# Altium footprint library Footprints.PcbLib: 67 footprints (part 3 of 5)
Each footprint in its own frame and in the unit in brackets; x right, y up, seen from the top. Pads: shape width x height; smd on the part's side, far side on the other; paste and mask are expansions set on the pad; w line width, h text height; cw(c..) or ccw(c..) is an arc to the next point about the centre after c.
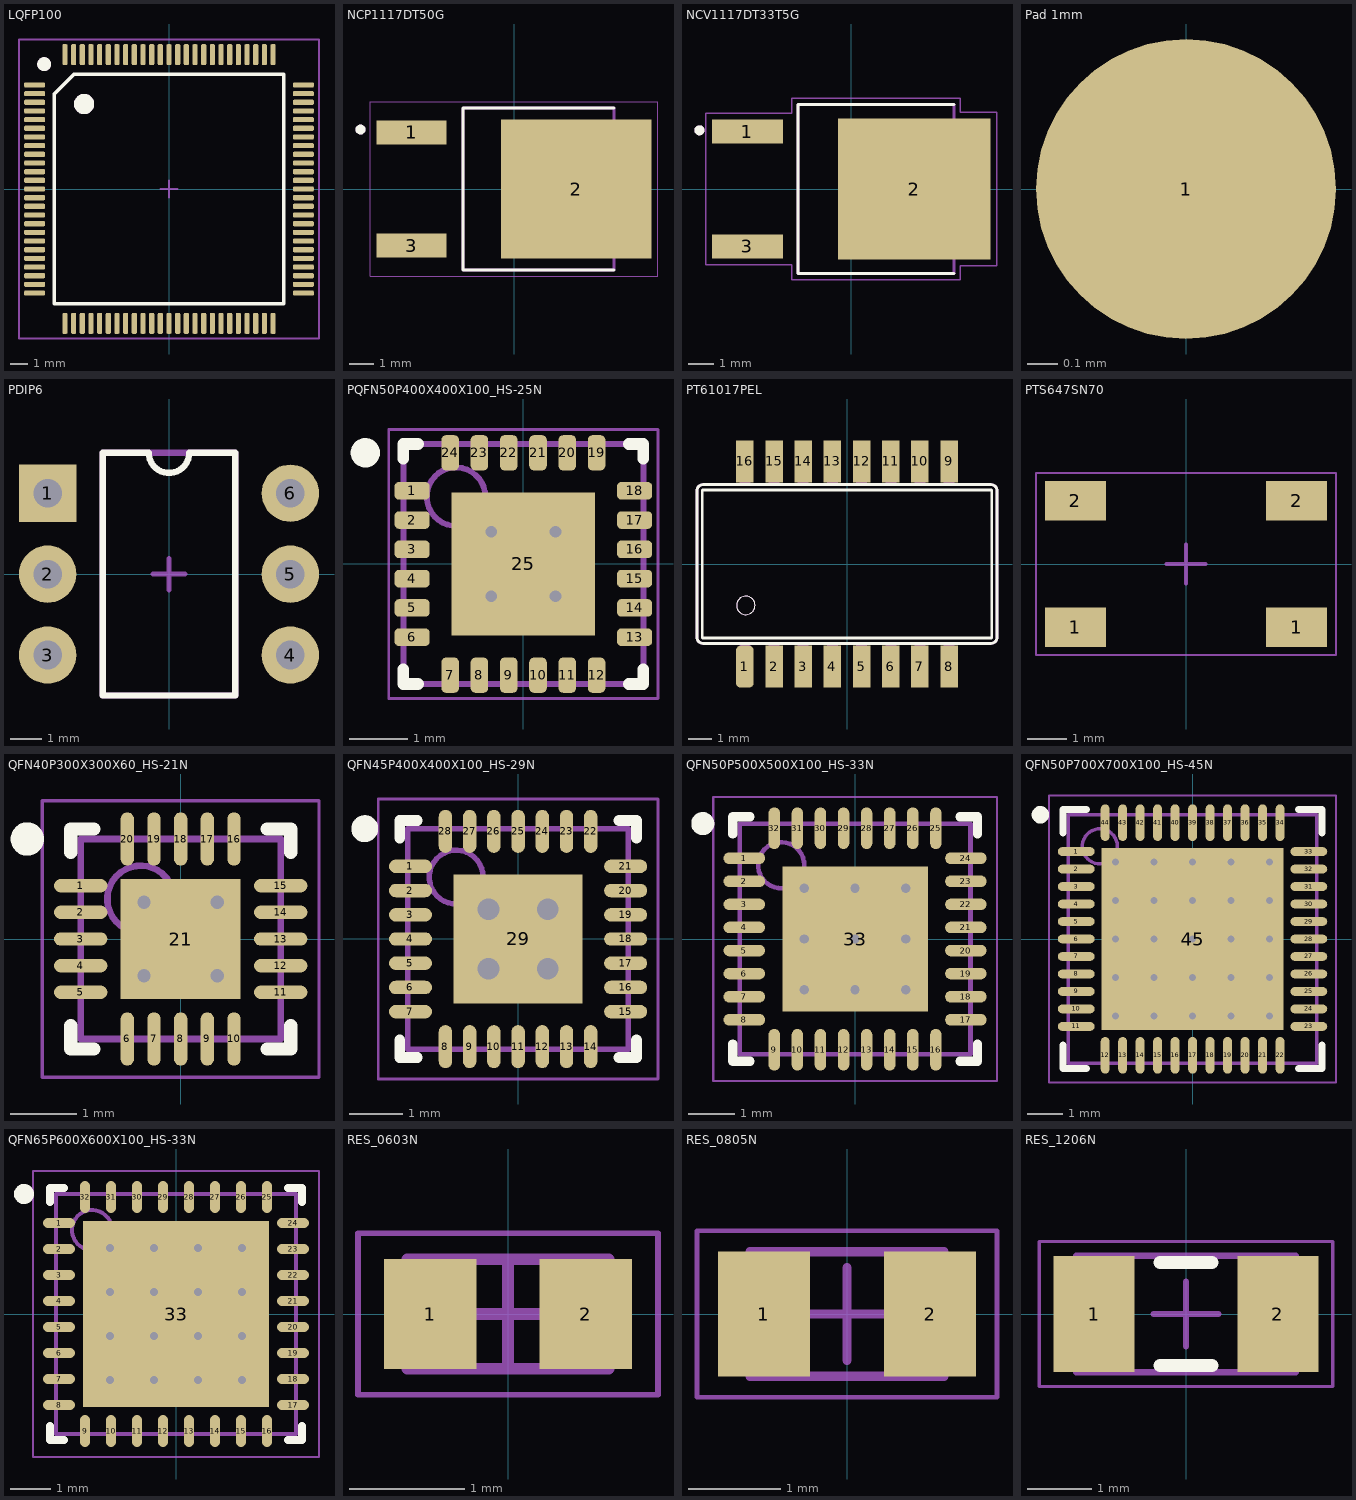
[diagram p2: the footprints below, top view; thin cyan lines are the x and y axes]

## LQFP100 [mm]
pads (100):
  rrect50% 1.2x0.3 smd: 1(-7.75,6) 2(-7.75,5.5) 3(-7.75,5) 4(-7.75,4.5) 5(-7.75,4) 6(-7.75,3.5) 7(-7.75,3) 8(-7.75,2.5) 9(-7.75,2) 10(-7.75,1.5) 11(-7.75,1) 12(-7.75,0.5) 13(-7.75,0) 14(-7.75,-0.5) 15(-7.75,-1) 16(-7.75,-1.5) 17(-7.75,-2) 18(-7.75,-2.5) 19(-7.75,-3) 20(-7.75,-3.5) 21(-7.75,-4) 22(-7.75,-4.5) 23(-7.75,-5) 24(-7.75,-5.5) 25(-7.75,-6) 51(7.75,-6) 52(7.75,-5.5) 53(7.75,-5) 54(7.75,-4.5) 55(7.75,-4) 56(7.75,-3.5) 57(7.75,-3) 58(7.75,-2.5) 59(7.75,-2) 60(7.75,-1.5) 61(7.75,-1) 62(7.75,-0.5) 63(7.75,0) 64(7.75,0.5) 65(7.75,1) 66(7.75,1.5) 67(7.75,2) 68(7.75,2.5) 69(7.75,3) 70(7.75,3.5) 71(7.75,4) 72(7.75,4.5) 73(7.75,5) 74(7.75,5.5) 75(7.75,6)
  rrect50% 0.3x1.2 smd: 26(-6,-7.75) 27(-5.5,-7.75) 28(-5,-7.75) 29(-4.5,-7.75) 30(-4,-7.75) 31(-3.5,-7.75) 32(-3,-7.75) 33(-2.5,-7.75) 34(-2,-7.75) 35(-1.5,-7.75) 36(-1,-7.75) 37(-0.5,-7.75) 38(0,-7.75) 39(0.5,-7.75) 40(1,-7.75) 41(1.5,-7.75) 42(2,-7.75) 43(2.5,-7.75) 44(3,-7.75) 45(3.5,-7.75) 46(4,-7.75) 47(4.5,-7.75) 48(5,-7.75) 49(5.5,-7.75) 50(6,-7.75) 76(6,7.75) 77(5.5,7.75) 78(5,7.75) 79(4.5,7.75) 80(4,7.75) 81(3.5,7.75) 82(3,7.75) 83(2.5,7.75) 84(2,7.75) 85(1.5,7.75) 86(1,7.75) 87(0.5,7.75) 88(0,7.75) 89(-0.5,7.75) 90(-1,7.75) 91(-1.5,7.75) 92(-2,7.75) 93(-2.5,7.75) 94(-3,7.75) 95(-3.5,7.75) 96(-4,7.75) 97(-4.5,7.75) 98(-5,7.75) 99(-5.5,7.75) 100(-6,7.75)
Top Overlay:
  circle w0.6: c-4.9,4.9 r0.283
  circle w0.4: c-7.2,7.2 r0.2
  lines w0.2: -6.615,-6.615 6.615,-6.615 6.615,6.615 -5.48,6.615 -6.615,5.48 -6.615,-6.615
Polarity (Mech13):
  circle w0.6: c-4.9,4.9 r0.283
  circle w0.4: c-7.2,7.2 r0.2
Mechanical 15:
  lines w0.1: -0.5,0 0.5,0 ; 0,-0.5 0,0.5 ; -8.65,-8.625 8.65,-8.625 8.65,8.625 -8.65,8.625 -8.65,-8.625
3D body "User Library-LQFP100-3.STEP": height 1.64, standoff 0.01, extent -8.072,-8.072 8.072,8.072

## NCP1117DT50G [mm] "LDO 5V"
pads (3):
  rect 2.83x0.97 smd: 1(-4.14,2.29) 3(-4.14,-2.29)
  rect 6.09x5.63 smd paste-4: 2(2.51,0)
Top Overlay:
  circle w0.2: c-6.2,2.4 r0.1
  lines w0.127: 4.03,-3.27 -2.065,-3.27 -2.065,3.27 4.03,3.27
Top Paste:
  region: 3.165,0.54 1.855,0.54 1.855,2.28 3.165,2.28
  region: 3.165,-2.28 1.855,-2.28 1.855,-0.54 3.165,-0.54
  region: 1.135,0.54 -0.175,0.54 -0.175,2.28 1.135,2.28
  region: 5.195,0.54 3.885,0.54 3.885,2.28 5.195,2.28
  region: 5.195,-2.28 3.885,-2.28 3.885,-0.54 5.195,-0.54
  region: 1.135,-2.28 -0.175,-2.28 -0.175,-0.54 1.135,-0.54
Polarity (Mech13):
  circle w0.2: c-6.2,2.4 r0.1
  lines w0.127: -2.065,-3.27 -2.065,3.27 4.03,3.27 4.03,-3.27 -2.065,-3.27
Mechanical 15:
  lines w0.05: -5.81,-3.52 -5.81,3.52 5.81,3.52 5.81,-3.52 -5.81,-3.52
3D body "step_temp.STEP": height 2.39, standoff -0.13, extent -4.953,-3.25 4.953,3.25

## NCV1117DT33T5G [mm] "NCV1117DT33T5G 3.3V LDO"
pads (3):
  rect 2.83x0.97 smd: 1(-4.14,2.29) 3(-4.14,-2.29)
  rect 6.09x5.63 smd paste-4: 2(2.51,0)
Top Overlay:
  circle w0.2: c-6.05,2.34 r0.1
  lines w0.127: 4.093,-3.37 -2.128,-3.37 -2.128,3.37 4.093,3.37
Top Paste:
  region: 5.195,-2.28 3.885,-2.28 3.885,-0.54 5.195,-0.54
  region: 3.165,-2.28 1.855,-2.28 1.855,-0.54 3.165,-0.54
  region: 1.135,-2.28 -0.175,-2.28 -0.175,-0.54 1.135,-0.54
  region: 1.135,0.54 -0.175,0.54 -0.175,2.28 1.135,2.28
  region: 5.195,0.54 3.885,0.54 3.885,2.28 5.195,2.28
  region: 3.165,0.54 1.855,0.54 1.855,2.28 3.165,2.28
Polarity (Mech13):
  circle w0.2: c-6.05,2.34 r0.1
  lines w0.127: -2.128,-3.37 4.093,-3.37 4.093,3.37 -2.128,3.37 -2.128,-3.37
Mechanical 15:
  lines w0.05: -5.805,-3.025 -2.378,-3.025 -2.378,-3.62 4.343,-3.62 4.343,-3.065 5.805,-3.065 5.805,3.065 4.343,3.065 4.343,3.62 -2.378,3.62 -2.378,3.025 -5.805,3.025 -5.805,-3.025
3D body "NCV1117DT33T5G.STEP": height 2.39, standoff -0.13, extent -4.953,-3.25 4.953,3.25

## Pad 1mm [mm] "Pad 1mm"
pads (1):
  round 1 smd: 1(0,0)

## PDIP6 [mm]
pads (6):
  rect 1.8x1.8 hole 0.9: 1(-3.81,2.54)
  round 1.8 hole 0.9: 2(-3.81,0) 3(-3.81,-2.54) 4(3.81,-2.54) 5(3.81,0) 6(3.81,2.54)
Top Overlay:
  lines w0.2: -2.075,-3.81 2.075,-3.81 2.075,3.81 0.635,3.81 cw(c0,3.81) -0.635,3.81 -2.075,3.81 -2.075,-3.81
Mechanical 15:
  lines w0.15: -0.5,0 0.5,0 ; 0,-0.5 0,0.5
  lines w0.2: -2.075,-3.81 2.075,-3.81 2.075,3.81 -0.635,3.81 -2.075,3.81 -2.075,-3.81
3D body "CircuitWorks-DIP6.step": height 4.38, standoff -3.21, extent -4,-4.04 4,4.04

## PQFN50P400X400X100_HS-25N [mm] "PQFN, 24-Leads, Body 4.00x4.00mm, Pitch 0.50mm, Thermal Pad 2.45x2.45mm, IPC Medium Density"
height 1
pads (25):
  rrect50% 0.6x0.3 smd: 1(-1.9,1.25) 2(-1.9,0.75) 3(-1.9,0.25) 4(-1.9,-0.25) 5(-1.9,-0.75) 6(-1.9,-1.25) 13(1.9,-1.25) 14(1.9,-0.75) 15(1.9,-0.25) 16(1.9,0.25) 17(1.9,0.75) 18(1.9,1.25)
  rrect50% 0.3x0.6 smd: 7(-1.25,-1.9) 8(-0.75,-1.9) 9(-0.25,-1.9) 10(0.25,-1.9) 11(0.75,-1.9) 12(1.25,-1.9) 19(1.25,1.9) 20(0.75,1.9) 21(0.25,1.9) 22(-0.25,1.9) 23(-0.75,1.9) 24(-1.25,1.9)
  rect 2.45x2.45 smd: 25(0,0)
via -0.55,0.55 diameter 0.5 hole 0.2
via 0.55,0.55 diameter 0.5 hole 0.2
via -0.55,-0.55 diameter 0.5 hole 0.2
via 0.55,-0.55 diameter 0.5 hole 0.2
Top Overlay:
  circle w0.25: c-2.7,1.9 r0.125
  lines w0.2: -2.05,-1.8 -2.05,-2.05 -1.8,-2.05 ; -2.05,1.8 -2.05,2.05 -1.8,2.05 ; 1.8,-2.05 2.05,-2.05 2.05,-1.8 ; 1.8,2.05 2.05,2.05 2.05,1.8
Polarity (Mech13):
  circle w0.1: c-1.15,1.15 r0.5
  lines w0.1: -2.05,-2.05 -2.05,2.05 2.05,2.05 2.05,-2.05 -2.05,-2.05
Mechanical 15:
  lines w0.05: -2.3,-2.3 -2.3,2.3 2.3,2.3 2.3,-2.3 -2.3,-2.3
  lines w0.1: -0.5,0 0.5,0 ; 0,-0.5 0,0.5
3D body "User Library-QFN 24 4x4-1.step": height 0.91, standoff 0.01, extent -2.002,-2.002 2.002,2.002

## PT61017PEL [mil] "PT61017PEL transformer"
pads (16):
  rrect50% 30x71.5 smd: 1(-175,-175.75)
  rect 30x71.5 smd: 2(-125,-175.75) 3(-75,-175.75) 4(-25,-175.75) 5(25,-175.75) 6(75,-175.75) 7(125,-175.75) 8(175,-175.75) 9(175,175.75) 10(125,175.75) 11(75,175.75) 12(25,175.75) 13(-25,175.75) 14(-75,175.75) 15(-125,175.75) 16(-175,175.75)
Top Overlay:
  circle w0: c-173.23,-70.87 r15.75
  lines w5: -256.89,-125.83 ccw(c-246.89,-125.83) -246.89,-135.83 246.89,-135.83 ccw(c246.89,-125.83) 256.89,-125.83 256.89,125.83 ccw(c246.89,125.83) 246.89,135.83 -246.89,135.83 ccw(c-246.89,125.83) -256.89,125.83 -256.89,-125.83 ; -247.83,-124.8 ccw(c-245.87,-124.8) -245.87,-126.77 245.87,-126.77 ccw(c245.87,-124.8) 247.83,-124.8 247.83,124.8 ccw(c245.87,124.8) 245.87,126.77 -245.87,126.77 ccw(c-245.87,124.8) -247.83,124.8 -247.83,-124.8
Polarity (Mech13):
  circle w0: c-173.23,-70.87 r15.75
  region: 184.06,135.83 165.94,135.83 165.94,183.07 184.06,183.07
  region: 134.06,135.83 115.94,135.83 115.94,183.07 134.06,183.07
  region: 84.06,135.83 65.94,135.83 65.94,183.07 84.06,183.07
  region: 34.06,135.83 15.94,135.83 15.94,183.07 34.06,183.07
  region: -165.94,135.83 -184.06,135.83 -184.06,183.07 -165.94,183.07
  region: -115.94,135.83 -134.06,135.83 -134.06,183.07 -115.94,183.07
  region: -65.94,135.83 -84.06,135.83 -84.06,183.07 -65.94,183.07
  region: -15.94,135.83 -34.06,135.83 -34.06,183.07 -15.94,183.07
  region: 184.06,-183.07 165.94,-183.07 165.94,-135.83 184.06,-135.83
  region: 134.06,-183.07 115.94,-183.07 115.94,-135.83 134.06,-135.83
  region: 84.06,-183.07 65.94,-183.07 65.94,-135.83 84.06,-135.83
  region: 34.06,-183.07 15.94,-183.07 15.94,-135.83 34.06,-135.83
  region: -165.94,-183.07 -184.06,-183.07 -184.06,-135.83 -165.94,-135.83
  region: -115.94,-183.07 -134.06,-183.07 -134.06,-135.83 -115.94,-135.83
  region: -65.94,-183.07 -84.06,-183.07 -84.06,-135.83 -65.94,-135.83
  region: -15.94,-183.07 -34.06,-183.07 -34.06,-135.83 -15.94,-135.83
  lines w5: -256.89,-125.83 ccw(c-246.89,-125.83) -246.89,-135.83 246.89,-135.83 ccw(c246.89,-125.83) 256.89,-125.83 256.89,125.83 ccw(c246.89,125.83) 246.89,135.83 -246.89,135.83 ccw(c-246.89,125.83) -256.89,125.83 -256.89,-125.83
3D body "step_temp.STEP": height 222.44, standoff 0, extent -251.97,-183.07 251.97,183.07

## PTS647SN70 [mm]
pads (4):
  rect 1.55x1 smd: 1(-2.8,-1.6) 1(2.8,-1.6) 2(-2.8,1.6) 2(2.8,1.6)
Mechanical 15:
  lines w0.05: -3.8,-2.3 3.8,-2.3 3.8,2.3 -3.8,2.3 -3.8,-2.3
  lines w0.1: -0.5,0 0.5,0 ; 0,-0.5 0,0.5
3D body "PTS647SN50SMTR2LFS.stp": height 5.01, standoff 0.01, extent -3.25,-2.25 3.25,2.25

## QFN40P300X300X60_HS-21N [mm] "QFN, 20-Leads, Body 3.00x3.00mm, Pitch 0.40mm, Thermal Pad 1.80x1.80mm, IPC Medium Density"
height 0.6
pads (21):
  oval 0.8x0.2 smd: 1(-1.5,0.8) 2(-1.5,0.4) 3(-1.5,0) 4(-1.5,-0.4) 5(-1.5,-0.8) 11(1.5,-0.8) 12(1.5,-0.4) 13(1.5,0) 14(1.5,0.4) 15(1.5,0.8)
  oval 0.2x0.8 smd: 6(-0.8,-1.5) 7(-0.4,-1.5) 8(0,-1.5) 9(0.4,-1.5) 10(0.8,-1.5) 16(0.8,1.5) 17(0.4,1.5) 18(0,1.5) 19(-0.4,1.5) 20(-0.8,1.5)
  rect 1.8x1.8 smd: 21(0,0)
via 0.55,-0.55 diameter 0.5 hole 0.2
via -0.55,-0.55 diameter 0.5 hole 0.2
via 0.55,0.55 diameter 0.5 hole 0.2
via -0.55,0.55 diameter 0.5 hole 0.2
Top Overlay:
  circle w0.25: c-2.3,1.5 r0.125
  lines w0.2: -1.65,-1.3 -1.65,-1.65 -1.3,-1.65 ; -1.65,1.3 -1.65,1.65 -1.3,1.65 ; 1.3,-1.65 1.65,-1.65 1.65,-1.3 ; 1.3,1.65 1.65,1.65 1.65,1.3
Polarity (Mech13):
  circle w0.1: c-0.6,0.6 r0.5
  lines w0.1: -1.5,-1.5 1.5,-1.5 1.5,1.5 -1.5,1.5 -1.5,-1.5
Mechanical 15:
  lines w0.05: -2.075,-2.075 2.075,-2.075 2.075,2.075 -2.075,2.075 -2.075,-2.075
  lines w0.1: -0.5,0 0.5,0 ; 0,-0.5 0,0.5
3D body "User Library-QFN40P300X300X60-20.step": height 0.61, standoff 0.01, extent -1.55,-1.55 1.55,1.55

## QFN45P400X400X100_HS-29N [mm] "QFN, 28-Leads, Body 4.00x4.00mm, Pitch 0.45mm, Thermal Pad 2.40x2.40mm, IPC Medium Density"
height 1
pads (29):
  oval 0.8x0.25 smd: 1(-2,1.35) 2(-2,0.9) 3(-2,0.45) 4(-2,0) 5(-2,-0.45) 6(-2,-0.9) 7(-2,-1.35) 15(2,-1.35) 16(2,-0.9) 17(2,-0.45) 18(2,0) 19(2,0.45) 20(2,0.9) 21(2,1.35)
  oval 0.25x0.8 smd: 8(-1.35,-2) 9(-0.9,-2) 10(-0.45,-2) 11(0,-2) 12(0.45,-2) 13(0.9,-2) 14(1.35,-2) 22(1.35,2) 23(0.9,2) 24(0.45,2) 25(0,2) 26(-0.45,2) 27(-0.9,2) 28(-1.35,2)
  rect 2.4x2.4 smd: 29(0,0)
via -0.55,0.55 diameter 0.8 hole 0.4
via 0.55,0.55 diameter 0.8 hole 0.4
via -0.55,-0.55 diameter 0.8 hole 0.4
via 0.55,-0.55 diameter 0.8 hole 0.4
Top Overlay:
  circle w0.25: c-2.85,2.05 r0.125
  lines w0.2: -2.2,-1.875 -2.2,-2.2 -1.875,-2.2 ; -2.2,1.875 -2.2,2.2 -1.875,2.2 ; 1.875,-2.2 2.2,-2.2 2.2,-1.875 ; 1.875,2.2 2.2,2.2 2.2,1.875
Polarity (Mech13):
  circle w0.1: c-1.15,1.15 r0.5
  lines w0.1: -2.05,-2.05 -2.05,2.05 2.05,2.05 2.05,-2.05 -2.05,-2.05
Mechanical 15:
  lines w0.05: -2.6,-2.6 -2.6,2.6 2.6,2.6 2.6,-2.6 -2.6,-2.6
  lines w0.1: -0.5,0 0.5,0 ; 0,-0.5 0,0.5
3D body: height 1, standoff 0.02, extent -2.05,-2.05 2.05,2.05

## QFN50P500X500X100_HS-33N [mm] "QFN, 32-Leads, Body 5.00x5.00mm, Pitch 0.50mm, Thermal Pad 3.15x3.15mm, IPC Medium Density"
height 1
pads (33):
  oval 0.9x0.25 smd: 1(-2.4,1.75) 2(-2.4,1.25) 3(-2.4,0.75) 4(-2.4,0.25) 5(-2.4,-0.25) 6(-2.4,-0.75) 7(-2.4,-1.25) 8(-2.4,-1.75) 17(2.4,-1.75) 18(2.4,-1.25) 19(2.4,-0.75) 20(2.4,-0.25) 21(2.4,0.25) 22(2.4,0.75) 23(2.4,1.25) 24(2.4,1.75)
  oval 0.25x0.9 smd: 9(-1.75,-2.4) 10(-1.25,-2.4) 11(-0.75,-2.4) 12(-0.25,-2.4) 13(0.25,-2.4) 14(0.75,-2.4) 15(1.25,-2.4) 16(1.75,-2.4) 25(1.75,2.4) 26(1.25,2.4) 27(0.75,2.4) 28(0.25,2.4) 29(-0.25,2.4) 30(-0.75,2.4) 31(-1.25,2.4) 32(-1.75,2.4)
  rect 3.15x3.15 smd: 33(0,0)
via -1.1,1.1 diameter 0.5 hole 0.2
via 0,1.1 diameter 0.5 hole 0.2
via 1.1,1.1 diameter 0.5 hole 0.2
via -1.1,0 diameter 0.5 hole 0.2
via 0,0 diameter 0.5 hole 0.2
via 1.1,0 diameter 0.5 hole 0.2
via -1.1,-1.1 diameter 0.5 hole 0.2
via 0,-1.1 diameter 0.5 hole 0.2
via 1.1,-1.1 diameter 0.5 hole 0.2
Top Overlay:
  circle w0.25: c-3.3,2.5 r0.125
  lines w0.2: -2.65,-2.275 -2.65,-2.65 -2.275,-2.65 ; -2.65,2.275 -2.65,2.65 -2.275,2.65 ; 2.275,-2.65 2.65,-2.65 2.65,-2.275 ; 2.275,2.65 2.65,2.65 2.65,2.275
Polarity (Mech13):
  circle w0.1: c-1.6,1.6 r0.5
  lines w0.1: -2.5,-2.5 -2.5,2.5 2.5,2.5 2.5,-2.5 -2.5,-2.5
Mechanical 15:
  lines w0.05: -3.075,-3.075 -3.075,3.075 3.075,3.075 3.075,-3.075 -3.075,-3.075
  lines w0.1: -0.5,0 0.5,0 ; 0,-0.5 0,0.5
3D body "User Library-QFN32-1.step": height 0.94, standoff 0.01, extent -2.5,-2.5 2.5,2.5

## QFN50P700X700X100_HS-45N [mm] "QFN, 44-Leads, Body 7.00x7.00mm, Pitch 0.50mm, Thermal Pad 5.20x5.20mm, IPC Medium Density"
height 1
pads (45):
  oval 1.05x0.25 smd: 1(-3.325,2.5) 2(-3.325,2) 3(-3.325,1.5) 4(-3.325,1) 5(-3.325,0.5) 6(-3.325,0) 7(-3.325,-0.5) 8(-3.325,-1) 9(-3.325,-1.5) 10(-3.325,-2) 11(-3.325,-2.5) 23(3.325,-2.5) 24(3.325,-2) 25(3.325,-1.5) 26(3.325,-1) 27(3.325,-0.5) 28(3.325,0) 29(3.325,0.5) 30(3.325,1) 31(3.325,1.5) 32(3.325,2) 33(3.325,2.5)
  oval 0.25x1.05 smd: 12(-2.5,-3.325) 13(-2,-3.325) 14(-1.5,-3.325) 15(-1,-3.325) 16(-0.5,-3.325) 17(0,-3.325) 18(0.5,-3.325) 19(1,-3.325) 20(1.5,-3.325) 21(2,-3.325) 22(2.5,-3.325) 34(2.5,3.325) 35(2,3.325) 36(1.5,3.325) 37(1,3.325) 38(0.5,3.325) 39(0,3.325) 40(-0.5,3.325) 41(-1,3.325) 42(-1.5,3.325) 43(-2,3.325) 44(-2.5,3.325)
  rect 5.2x5.2 smd: 45(0,0)
via 2.2,-2.2 diameter 0.5 hole 0.2
via 1.1,-2.2 diameter 0.5 hole 0.2
via 0,-2.2 diameter 0.5 hole 0.2
via -1.1,-2.2 diameter 0.5 hole 0.2
via -2.2,-2.2 diameter 0.5 hole 0.2
via 2.2,-1.1 diameter 0.5 hole 0.2
via 1.1,-1.1 diameter 0.5 hole 0.2
via 0,-1.1 diameter 0.5 hole 0.2
via -1.1,-1.1 diameter 0.5 hole 0.2
via -2.2,-1.1 diameter 0.5 hole 0.2
via 2.2,0 diameter 0.5 hole 0.2
via 1.1,0 diameter 0.5 hole 0.2
via 0,0 diameter 0.5 hole 0.2
via -1.1,0 diameter 0.5 hole 0.2
via -2.2,0 diameter 0.5 hole 0.2
via 2.2,1.1 diameter 0.5 hole 0.2
via 1.1,1.1 diameter 0.5 hole 0.2
via 0,1.1 diameter 0.5 hole 0.2
via -1.1,1.1 diameter 0.5 hole 0.2
via -2.2,1.1 diameter 0.5 hole 0.2
via 2.2,2.2 diameter 0.5 hole 0.2
via 1.1,2.2 diameter 0.5 hole 0.2
via 0,2.2 diameter 0.5 hole 0.2
via -1.1,2.2 diameter 0.5 hole 0.2
via -2.2,2.2 diameter 0.5 hole 0.2
Top Overlay:
  circle w0.25: c-4.35,3.55 r0.125
  lines w0.2: -3.7,-3.025 -3.7,-3.7 -3.025,-3.7 ; -3.7,3.025 -3.7,3.7 -3.025,3.7 ; 3.025,-3.7 3.7,-3.7 3.7,-3.025 ; 3.025,3.7 3.7,3.7 3.7,3.025
Polarity (Mech13):
  circle w0.1: c-2.65,2.65 r0.5
  lines w0.1: -3.55,-3.55 3.55,-3.55 3.55,3.55 -3.55,3.55 -3.55,-3.55
Mechanical 15:
  lines w0.05: -4.1,-4.1 4.1,-4.1 4.1,4.1 -4.1,4.1 -4.1,-4.1
  lines w0.1: -0.5,0 0.5,0 ; 0,-0.5 0,0.5
3D body "QFN50P700X700X100_HS-45N.step": height 1, standoff 0, extent -3.57,-3.57 3.57,3.57

## QFN65P600X600X100_HS-33N [mm] "QFN, 32-Leads, Body 6.00x6.00mm, Pitch 0.65mm, Thermal Pad 4.65x4.65mm, IPC Medium Density"
height 1
pads (33):
  oval 0.8x0.25 smd: 1(-2.925,2.275) 2(-2.925,1.625) 3(-2.925,0.975) 4(-2.925,0.325) 5(-2.925,-0.325) 6(-2.925,-0.975) 7(-2.925,-1.625) 8(-2.925,-2.275) 17(2.925,-2.275) 18(2.925,-1.625) 19(2.925,-0.975) 20(2.925,-0.325) 21(2.925,0.325) 22(2.925,0.975) 23(2.925,1.625) 24(2.925,2.275)
  oval 0.25x0.8 smd: 9(-2.275,-2.925) 10(-1.625,-2.925) 11(-0.975,-2.925) 12(-0.325,-2.925) 13(0.325,-2.925) 14(0.975,-2.925) 15(1.625,-2.925) 16(2.275,-2.925) 25(2.275,2.925) 26(1.625,2.925) 27(0.975,2.925) 28(0.325,2.925) 29(-0.325,2.925) 30(-0.975,2.925) 31(-1.625,2.925) 32(-2.275,2.925)
  rect 4.65x4.65 smd: 33(0,0)
via -1.65,1.65 diameter 0.5 hole 0.2
via -0.55,1.65 diameter 0.5 hole 0.2
via 0.55,1.65 diameter 0.5 hole 0.2
via 1.65,1.65 diameter 0.5 hole 0.2
via -1.65,0.55 diameter 0.5 hole 0.2
via -0.55,0.55 diameter 0.5 hole 0.2
via 0.55,0.55 diameter 0.5 hole 0.2
via 1.65,0.55 diameter 0.5 hole 0.2
via -1.65,-0.55 diameter 0.5 hole 0.2
via -0.55,-0.55 diameter 0.5 hole 0.2
via 0.55,-0.55 diameter 0.5 hole 0.2
via 1.65,-0.55 diameter 0.5 hole 0.2
via -1.65,-1.65 diameter 0.5 hole 0.2
via -0.55,-1.65 diameter 0.5 hole 0.2
via 0.55,-1.65 diameter 0.5 hole 0.2
via 1.65,-1.65 diameter 0.5 hole 0.2
Top Overlay:
  circle w0.25: c-3.8,3 r0.125
  lines w0.2: -3.15,-2.8 -3.15,-3.15 -2.8,-3.15 ; -3.15,2.8 -3.15,3.15 -2.8,3.15 ; 2.8,-3.15 3.15,-3.15 3.15,-2.8 ; 2.8,3.15 3.15,3.15 3.15,2.8
Polarity (Mech13):
  circle w0.1: c-2.1,2.1 r0.5
  lines w0.1: -3,-3 -3,3 3,3 3,-3 -3,-3
Mechanical 15:
  lines w0.05: -3.575,-3.575 -3.575,3.575 3.575,3.575 3.575,-3.575 -3.575,-3.575
  lines w0.1: -0.5,0 0.5,0 ; 0,-0.5 0,0.5
3D body: height 1, standoff 0, extent -3,-3 3,3

## RES_0603N [mm] "Chip Resistor, 2-Leads, Body 1.60x0.80mm, IPC Medium Density"
height 0.55
pads (2):
  rect 0.8x0.95 smd: 1(-0.675,0) 2(0.675,0)
Mechanical 1:
  lines w0.1: -0.875,-0.475 -0.875,0.475 0.875,0.475 0.875,-0.475 -0.875,-0.475
Mechanical 15:
  lines w0.05: -1.3,-0.7 -1.3,0.7 1.3,0.7 1.3,-0.7 -1.3,-0.7
  lines w0.1: -0.475,0 0.475,0 ; 0,-0.475 0,0.475
3D body "RES_SMD_0603.step": height 0.55, standoff 0, extent -0.85,-0.45 0.85,0.45

## RES_0805N [mm] "Chip Resistor, 2-Leads, Body 2.1x1.35mm, IPC Medium Density"
height 0.6
pads (2):
  rect 1x1.35 smd: 1(-0.9,0) 2(0.9,0)
Mechanical 1:
  lines w0.1: -1.05,-0.675 1.05,-0.675 1.05,0.675 -1.05,0.675 -1.05,-0.675
Mechanical 15:
  lines w0.05: -1.625,-0.9 -1.625,0.9 1.625,0.9 1.625,-0.9 -1.625,-0.9
  lines w0.1: -0.5,0 0.5,0 ; 0,-0.5 0,0.5
3D body "RESC2012X06N.step": height 0.6, standoff 0, extent -1.05,-0.675 1.05,0.675

## RES_1206N [mm] "Chip Resistor, 2-Leads, Body 3.40x1.80mm, IPC Medium Density"
height 0.62
pads (2):
  rect 1.25x1.8 smd: 1(-1.425,0) 2(1.425,0)
Top Overlay:
  lines w0.2: -0.4,-0.8 0.4,-0.8 ; -0.4,0.8 0.4,0.8
Mechanical 1:
  lines w0.1: -1.7,-0.9 1.7,-0.9 1.7,0.9 -1.7,0.9 -1.7,-0.9
Mechanical 15:
  lines w0.05: -2.275,-1.125 2.275,-1.125 2.275,1.125 -2.275,1.125 -2.275,-1.125
  lines w0.1: -0.5,0 0.5,0 ; 0,-0.5 0,0.5
3D body "RESC3216X06N.step": height 0.62, standoff 0, extent -1.7,-0.9 1.7,0.9